# Altium footprint library PCB_IntegratedCircuit.PcbLib: 82 footprints (part 3 of 6)
Each footprint in its own frame and in the unit in brackets; x right, y up, seen from the top. Pads: shape width x height; smd on the part's side, far side on the other; paste and mask are expansions set on the pad; w line width, h text height; cw(c..) or ccw(c..) is an arc to the next point about the centre after c.
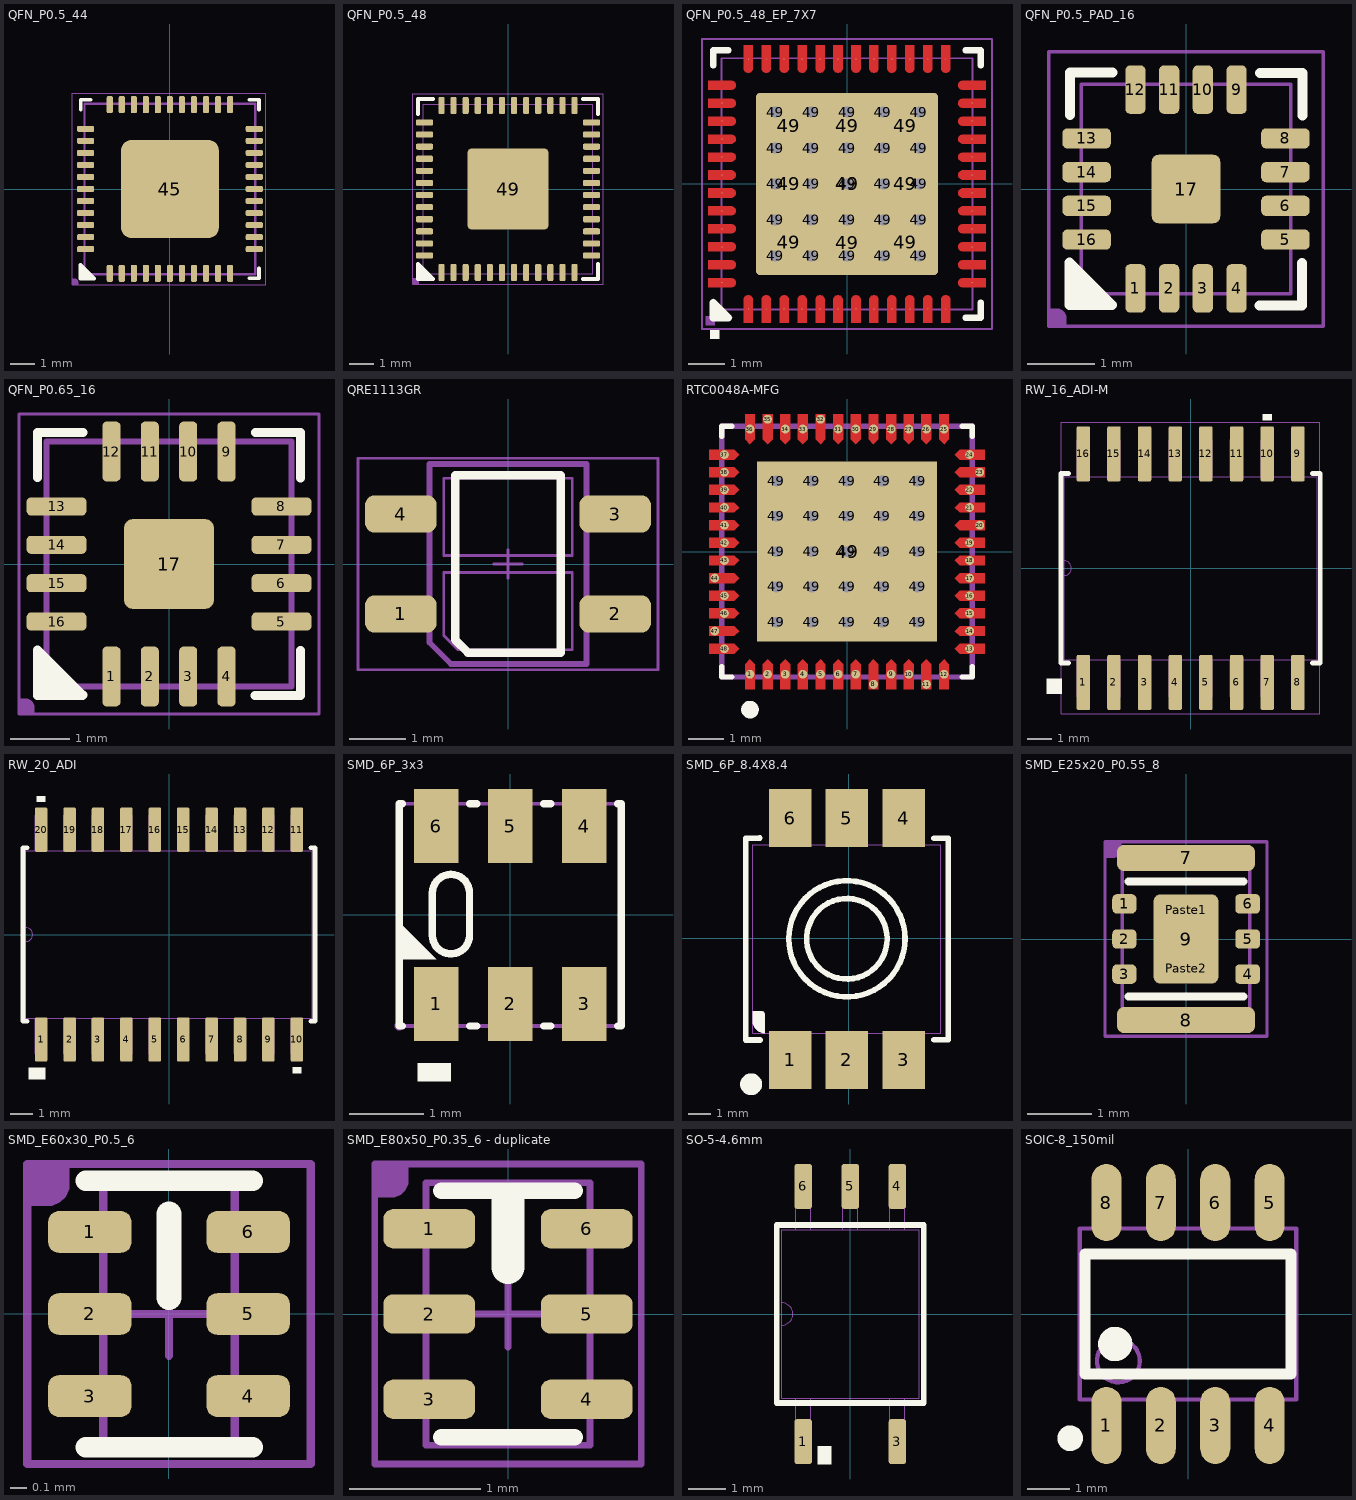
[diagram p2: the footprints below, top view; thin cyan lines are the x and y axes]

## QFN_P0.5_44 [mil]
height 39.37
pads (45):
  rrect50% 10x28 smd: 1(-98.43,-138) 2(-78.74,-138) 3(-59.06,-138) 4(-39.37,-138) 5(-19.68,-138) 6(0,-138) 7(19.69,-138) 8(39.37,-138) 9(59.06,-138) 10(78.74,-138) 11(98.43,-138) 23(98.43,138) 24(78.74,138) 25(59.05,138) 26(39.37,138) 27(19.68,138) 28(0,138) 29(-19.69,138) 30(-39.37,138) 31(-59.06,138) 32(-78.74,138) 33(-98.43,138)
  rrect50% 28x10 smd: 12(138,-98.43) 13(138,-78.74) 14(138,-59.06) 15(138,-39.37) 16(138,-19.69) 17(138,0) 18(138,19.68) 19(138,39.37) 20(138,59.06) 21(138,78.74) 22(138,98.43) 34(-138,98.43) 35(-138,78.74) 36(-138,59.06) 37(-138,39.37) 38(-138,19.68) 39(-138,0) 40(-138,-19.69) 41(-138,-39.37) 42(-138,-59.06) 43(-138,-78.74) 44(-138,-98.43)
  rrect20% 160x160 smd: 45(0,0)
Top Overlay:
  region: -146.34,-124.34 -146.34,-146.34 -124.34,-146.34
  lines w6: -145.76,129.76 -145.76,145.76 -129.76,145.76 ; 129.76,-145.76 145.76,-145.76 145.76,-129.76 ; 129.76,145.76 145.76,145.76 145.76,129.76 ; -146.34,-146.34 -146.34,-124.34 -124.34,-146.34 -146.34,-146.34
Top Solder:
  region: 107.43,-152 107.43,-124 -107.43,-124 -107.43,-152
  region: 107.43,124 107.43,152 -107.43,152 -107.43,124
  region: -124,107.43 -152,107.43 -152,-107.43 -124,-107.43
  region: 152,107.43 124,107.43 124,-107.43 152,-107.43
Mechanical 13:
  lines w2: -10,0 10,0 ; 0,-10 0,10
  lines w4: -139.76,-139.76 -139.76,139.76 139.76,139.76 139.76,-139.76 -139.76,-139.76
T-Component:
  region: -160,-157 -160,-147 -155,-147 -154.01,-147 -152.17,-147.76 -150.76,-149.17 -150,-151.01 -150,-152 -150,-157
  lines w2: -160,-157 157,-157 157,157 -160,157 -160,-157
3D body "User Library-smd_qfn-44-2.STEP": height 35.43, standoff 0, extent -137.84,-137.82 137.83,137.84

## QFN_P0.5_48 [mil]
height 21.65
pads (49):
  rrect50% 10x28 smd: 1(-108.27,-136) 2(-88.58,-136) 3(-68.9,-136) 4(-49.21,-136) 5(-29.53,-136) 6(-9.84,-136) 7(9.84,-136) 8(29.53,-136) 9(49.21,-136) 10(68.9,-136) 11(88.58,-136) 12(108.27,-136) 25(108.27,136) 26(88.58,136) 27(68.9,136) 28(49.21,136) 29(29.53,136) 30(9.84,136) 31(-9.84,136) 32(-29.53,136) 33(-49.21,136) 34(-68.9,136) 35(-88.58,136) 36(-108.27,136)
  rrect50% 28x10 smd: 13(136,-108.27) 14(136,-88.58) 15(136,-68.9) 16(136,-49.21) 17(136,-29.53) 18(136,-9.84) 19(136,9.84) 20(136,29.53) 21(136,49.21) 22(136,68.9) 23(136,88.58) 24(136,108.27) 37(-136,108.27) 38(-136,88.58) 39(-136,68.9) 40(-136,49.21) 41(-136,29.53) 42(-136,9.84) 43(-136,-9.84) 44(-136,-29.53) 45(-136,-49.21) 46(-136,-68.9) 47(-136,-88.58) 48(-136,-108.27)
  rrect10% 132x132 smd: 49(0,0)
Top Overlay:
  region: -146.67,-146.67 -146.67,-122 -122,-146.67
  lines w6: -146.67,122 -146.67,146.67 -122,146.67 ; 122,-146.67 146.67,-146.67 146.67,-122 ; 122,146.67 146.67,146.67 146.67,122 ; -146.67,-146.67 -146.67,-122 -122,-146.67 -146.67,-146.67
Top Solder:
  region: 108.27,-150 108.27,-122 -108.27,-122 -108.27,-150
  region: 150,108.27 122,108.27 122,-108.27 150,-108.27
  region: -108.27,150 -108.27,122 108.27,122 108.27,150
  rectangle: -150,-108.27 -122,108.27
Mechanical 13:
  lines w2: -10,0 10,0 ; 0,-10 0,10 ; -137.8,-137.79 137.8,-137.79 137.8,137.8 -137.8,137.8 -137.8,-137.79
T-Component:
  region: -155,-155 -155,-145 -150,-145 -149.01,-145 -147.17,-145.76 -145.76,-147.17 -145,-149.01 -145,-150 -145,-155
  lines w2: -155,-155 155,-155 155,155 -155,155 -155,-155
3D body "QFN50P700X700X55-48L.step": height 21.65, standoff 0, extent -138.59,-138.58 138.58,138.58

## QFN_P0.5_48_EP_7X7 [mil]
pads (83):
  round 1 smd paste-1 mask+3: 1(-108.27,-137) 2(-88.58,-137) 3(-68.9,-137) 4(-49.21,-137) 5(-29.53,-137) 6(-9.84,-137) 7(9.84,-137) 8(29.53,-137) 9(49.21,-137) 10(68.9,-137) 11(88.58,-137) 12(108.27,-137) 13(137,-108.27) 14(137,-88.58) 15(137,-68.9) 16(137,-49.21) 17(137,-29.53) 18(137,-9.84) 19(137,9.84) 20(137,29.53) 21(137,49.21) 22(137,68.9) 23(137,88.58) 24(137,108.27) 25(108.27,137) 26(88.58,137) 27(68.9,137) 28(49.21,137) 29(29.53,137) 30(9.84,137) 31(-9.84,137) 32(-29.53,137) 33(-49.21,137) 34(-68.9,137) 35(-88.58,137) 36(-108.27,137) 37(-137,108.27) 38(-137,88.58) 39(-137,68.9) 40(-137,49.21) 41(-137,29.53) 42(-137,9.84) 43(-137,-9.84) 44(-137,-29.53) 45(-137,-49.21) 46(-137,-68.9) 47(-137,-88.58) 48(-137,-108.27)
  round 23.62 / inner round 60 / far side round 23.62 hole 12 paste-99999 mask-11.5: 49(-78.74,-78.74) 49(-78.74,-39.37) 49(-78.74,0) 49(-78.74,39.37) 49(-78.74,78.74) 49(-39.37,-78.74) 49(-39.37,-39.37) 49(-39.37,0) 49(-39.37,39.37) 49(-39.37,78.74) 49(0,-78.74) 49(0,-39.37) 49(0,0) 49(0,39.37) 49(0,78.74) 49(39.37,-78.74) 49(39.37,-39.37) 49(39.37,39.37) 49(39.37,78.74) 49(78.74,-78.74) 49(78.74,-39.37) 49(78.74,0) 49(78.74,39.37) 49(78.74,78.74)
  rrect10% 53x53 on Top Paste: 49(-64,-64) 49(-64,0) 49(-64,64) 49(0,-64.63) 49(0,0) 49(0,64) 49(64,-64) 49(64,0) 49(64,64)
  rrect5% 200x200 smd paste-99999 mask+3: 49(0,0)
  round 23.62 hole 12 paste-99999 mask-11.5: 49(39.37,0)
Top Layer:
  region: -152,103.27 -152,113.27 -127,113.27 -126.01,113.27 -124.17,112.51 -122.76,111.1 -122,109.26 -122,108.27 -122,107.27 -122.76,105.44 -124.17,104.03 -126.01,103.27 -127,103.27
  region: -152,83.58 -152,93.58 -127,93.58 -126.01,93.58 -124.17,92.82 -122.76,91.41 -122,89.58 -122,88.58 -122,87.59 -122.76,85.75 -124.17,84.34 -126.01,83.58 -127,83.58
  region: -152,44.21 -152,54.21 -127,54.21 -126.01,54.21 -124.17,53.45 -122.76,52.04 -122,50.21 -122,49.21 -122,48.22 -122.76,46.38 -124.17,44.97 -126.01,44.21 -127,44.21
  region: -152,63.9 -152,73.9 -127,73.9 -126.01,73.9 -124.17,73.14 -122.76,71.73 -122,69.89 -122,68.9 -122,67.9 -122.76,66.07 -124.17,64.66 -126.01,63.9 -127,63.9
  region: -152,4.84 -152,14.84 -127,14.84 -126.01,14.84 -124.17,14.08 -122.76,12.67 -122,10.84 -122,9.84 -122,8.85 -122.76,7.01 -124.17,5.6 -126.01,4.84 -127,4.84
  region: -152,24.53 -152,34.53 -127,34.53 -126.01,34.53 -124.17,33.77 -122.76,32.36 -122,30.52 -122,29.53 -122,28.53 -122.76,26.7 -124.17,25.29 -126.01,24.53 -127,24.53
  region: -152,-34.53 -152,-24.53 -127,-24.53 -126.01,-24.53 -124.17,-25.29 -122.76,-26.7 -122,-28.53 -122,-29.53 -122,-30.52 -122.76,-32.36 -124.17,-33.77 -126.01,-34.53 -127,-34.53
  region: -152,-14.84 -152,-4.84 -127,-4.84 -126.01,-4.84 -124.17,-5.6 -122.76,-7.01 -122,-8.85 -122,-9.84 -122,-10.84 -122.76,-12.67 -124.17,-14.08 -126.01,-14.84 -127,-14.84
  region: -152,-73.9 -152,-63.9 -127,-63.9 -126.01,-63.9 -124.17,-64.66 -122.76,-66.07 -122,-67.9 -122,-68.9 -122,-69.89 -122.76,-71.73 -124.17,-73.14 -126.01,-73.9 -127,-73.9
  region: -152,-54.21 -152,-44.21 -127,-44.21 -126.01,-44.21 -124.17,-44.97 -122.76,-46.38 -122,-48.22 -122,-49.21 -122,-50.21 -122.76,-52.04 -124.17,-53.45 -126.01,-54.21 -127,-54.21
  region: -152,-113.27 -152,-103.27 -127,-103.27 -126.01,-103.27 -124.17,-104.03 -122.76,-105.44 -122,-107.27 -122,-108.27 -122,-109.26 -122.76,-111.1 -124.17,-112.51 -126.01,-113.27 -127,-113.27
  region: -152,-93.58 -152,-83.58 -127,-83.58 -126.01,-83.58 -124.17,-84.34 -122.76,-85.75 -122,-87.59 -122,-88.58 -122,-89.58 -122.76,-91.42 -124.17,-92.82 -126.01,-93.58 -127,-93.58
  region: -113.27,127 -113.27,152 -103.27,152 -103.27,127 -103.27,126.01 -104.03,124.17 -105.44,122.76 -107.27,122 -108.27,122 -109.26,122 -111.1,122.76 -112.51,124.17 -113.27,126.01
  region: -93.58,127 -93.58,152 -83.58,152 -83.58,127 -83.58,126.01 -84.34,124.17 -85.75,122.76 -87.59,122 -88.58,122 -89.58,122 -91.41,122.76 -92.82,124.17 -93.58,126.01
  region: -73.9,127 -73.9,152 -63.9,152 -63.9,127 -63.9,126.01 -64.66,124.17 -66.07,122.76 -67.9,122 -68.9,122 -69.89,122 -71.73,122.76 -73.14,124.17 -73.9,126.01
  region: -54.21,127 -54.21,152 -44.21,152 -44.21,127 -44.21,126.01 -44.97,124.17 -46.38,122.76 -48.22,122 -49.21,122 -50.21,122 -52.04,122.76 -53.45,124.17 -54.21,126.01
  region: -34.53,127 -34.53,152 -24.53,152 -24.53,127 -24.53,126.01 -25.29,124.17 -26.7,122.76 -28.53,122 -29.53,122 -30.52,122 -32.36,122.76 -33.77,124.17 -34.53,126.01
  region: -14.84,127 -14.84,152 -4.84,152 -4.84,127 -4.84,126.01 -5.6,124.17 -7.01,122.76 -8.85,122 -9.84,122 -10.84,122 -12.67,122.76 -14.08,124.17 -14.84,126.01
  region: 4.84,127 4.84,152 14.84,152 14.84,127 14.84,126.01 14.08,124.17 12.67,122.76 10.84,122 9.84,122 8.85,122 7.01,122.76 5.6,124.17 4.84,126.01
  region: 24.53,127 24.53,152 34.53,152 34.53,127 34.53,126.01 33.77,124.17 32.36,122.76 30.52,122 29.53,122 28.53,122 26.7,122.76 25.29,124.17 24.53,126.01
  region: 44.21,127 44.21,152 54.21,152 54.21,127 54.21,126.01 53.45,124.17 52.04,122.76 50.21,122 49.21,122 48.22,122 46.38,122.76 44.97,124.17 44.21,126.01
  region: 63.9,127 63.9,152 73.9,152 73.9,127 73.9,126.01 73.14,124.17 71.73,122.76 69.89,122 68.9,122 67.9,122 66.07,122.76 64.66,124.17 63.9,126.01
  region: 83.58,127 83.58,152 93.58,152 93.58,127 93.58,126.01 92.82,124.17 91.41,122.76 89.58,122 88.58,122 87.59,122 85.75,122.76 84.34,124.17 83.58,126.01
  region: 103.27,127 103.27,152 113.27,152 113.27,127 113.27,126.01 112.51,124.17 111.1,122.76 109.26,122 108.27,122 107.27,122 105.44,122.76 104.03,124.17 103.27,126.01
  region: 122,-108.27 122,-109.26 122.76,-111.1 124.17,-112.51 126.01,-113.27 127,-113.27 152,-113.27 152,-103.27 127,-103.27 126.01,-103.27 124.17,-104.03 122.76,-105.44 122,-107.27
  region: 122,-88.58 122,-89.58 122.76,-91.42 124.17,-92.82 126.01,-93.58 127,-93.58 152,-93.58 152,-83.58 127,-83.58 126.01,-83.58 124.17,-84.34 122.76,-85.75 122,-87.59
  region: 122,-49.21 122,-50.21 122.76,-52.04 124.17,-53.45 126.01,-54.21 127,-54.21 152,-54.21 152,-44.21 127,-44.21 126.01,-44.21 124.17,-44.97 122.76,-46.38 122,-48.22
  region: 122,-29.53 122,-30.52 122.76,-32.36 124.17,-33.77 126.01,-34.53 127,-34.53 152,-34.53 152,-24.53 127,-24.53 126.01,-24.53 124.17,-25.29 122.76,-26.7 122,-28.53
  region: 122,-9.84 122,-10.84 122.76,-12.67 124.17,-14.08 126.01,-14.84 127,-14.84 152,-14.84 152,-4.84 127,-4.84 126.01,-4.84 124.17,-5.6 122.76,-7.01 122,-8.85
  region: 122,9.84 122,8.85 122.76,7.01 124.17,5.6 126.01,4.84 127,4.84 152,4.84 152,14.84 127,14.84 126.01,14.84 124.17,14.08 122.76,12.67 122,10.84
  region: 122,29.53 122,28.53 122.76,26.7 124.17,25.29 126.01,24.53 127,24.53 152,24.53 152,34.53 127,34.53 126.01,34.53 124.17,33.77 122.76,32.36 122,30.52
  region: 122,49.21 122,48.22 122.76,46.38 124.17,44.97 126.01,44.21 127,44.21 152,44.21 152,54.21 127,54.21 126.01,54.21 124.17,53.45 122.76,52.04 122,50.21
  region: 122,68.9 122,67.9 122.76,66.07 124.17,64.66 126.01,63.9 127,63.9 152,63.9 152,73.9 127,73.9 126.01,73.9 124.17,73.14 122.76,71.73 122,69.89
  region: 122,88.58 122,87.59 122.76,85.75 124.17,84.34 126.01,83.58 127,83.58 152,83.58 152,93.58 127,93.58 126.01,93.58 124.17,92.82 122.76,91.41 122,89.58
  region: 122,108.27 122,107.27 122.76,105.44 124.17,104.03 126.01,103.27 127,103.27 152,103.27 152,113.27 127,113.27 126.01,113.27 124.17,112.51 122.76,111.1 122,109.26
  region: 122,-68.9 122,-69.89 122.76,-71.73 124.17,-73.14 126.01,-73.9 127,-73.9 152,-73.9 152,-63.9 127,-63.9 126.01,-63.9 124.17,-64.66 122.76,-66.07 122,-67.9
  region: -93.58,-152 -93.58,-127 -93.58,-126.01 -92.82,-124.17 -91.41,-122.76 -89.58,-122 -88.58,-122 -87.59,-122 -85.75,-122.76 -84.34,-124.17 -83.58,-126.01 -83.58,-127 -83.58,-152
  region: -113.27,-152 -113.27,-127 -113.27,-126.01 -112.51,-124.17 -111.1,-122.76 -109.26,-122 -108.27,-122 -107.27,-122 -105.44,-122.76 -104.03,-124.17 -103.27,-126.01 -103.27,-127 -103.27,-152
  region: 103.27,-152 103.27,-127 103.27,-126.01 104.03,-124.17 105.44,-122.76 107.27,-122 108.27,-122 109.26,-122 111.1,-122.76 112.51,-124.17 113.27,-126.01 113.27,-127 113.27,-152
  region: 83.58,-152 83.58,-127 83.58,-126.01 84.34,-124.17 85.75,-122.76 87.59,-122 88.58,-122 89.58,-122 91.41,-122.76 92.82,-124.17 93.58,-126.01 93.58,-127 93.58,-152
  region: -73.9,-152 -73.9,-127 -73.9,-126.01 -73.14,-124.17 -71.73,-122.76 -69.89,-122 -68.9,-122 -67.9,-122 -66.07,-122.76 -64.66,-124.17 -63.9,-126.01 -63.9,-127 -63.9,-152
  region: -54.21,-152 -54.21,-127 -54.21,-126.01 -53.45,-124.17 -52.04,-122.76 -50.21,-122 -49.21,-122 -48.22,-122 -46.38,-122.76 -44.97,-124.17 -44.21,-126.01 -44.21,-127 -44.21,-152
  region: -34.53,-152 -34.53,-127 -34.53,-126.01 -33.77,-124.17 -32.36,-122.76 -30.52,-122 -29.53,-122 -28.53,-122 -26.7,-122.76 -25.29,-124.17 -24.53,-126.01 -24.53,-127 -24.53,-152
  region: -14.84,-152 -14.84,-127 -14.84,-126.01 -14.08,-124.17 -12.67,-122.76 -10.84,-122 -9.84,-122 -8.85,-122 -7.01,-122.76 -5.6,-124.17 -4.84,-126.01 -4.84,-127 -4.84,-152
  region: 4.84,-152 4.84,-127 4.84,-126.01 5.6,-124.17 7.01,-122.76 8.85,-122 9.84,-122 10.84,-122 12.67,-122.76 14.08,-124.17 14.84,-126.01 14.84,-127 14.84,-152
  region: 24.53,-152 24.53,-127 24.53,-126.01 25.29,-124.17 26.7,-122.76 28.53,-122 29.53,-122 30.52,-122 32.36,-122.76 33.77,-124.17 34.53,-126.01 34.53,-127 34.53,-152
  region: 44.21,-152 44.21,-127 44.21,-126.01 44.97,-124.17 46.38,-122.76 48.22,-122 49.21,-122 50.21,-122 52.04,-122.76 53.45,-124.17 54.21,-126.01 54.21,-127 54.21,-152
  region: 63.9,-152 63.9,-127 63.9,-126.01 64.66,-124.17 66.07,-122.76 67.9,-122 68.9,-122 69.89,-122 71.73,-122.76 73.14,-124.17 73.9,-126.01 73.9,-127 73.9,-152
Top Overlay:
  rectangle: -150,-170 -140,-160
  region: -146.67,-146.67 -146.67,-126 -126,-146.67
  lines w7: -146.67,130 -146.67,146.67 -130,146.67 ; 130,-146.67 146.67,-146.67 146.67,-130 ; 130,146.67 146.67,146.67 146.67,130
  lines w8: -146.67,-146.67 -130,-146.67 -146.67,-130 -146.67,-146.67
Mechanical 13:
  lines w2: -10,0 10,0 ; 0,-10 0,10 ; -137.8,-137.79 137.8,-137.79 137.8,137.8 -137.8,137.8 -137.8,-137.79
T-Component:
  region: -155,-155 -155,-145 -150,-145 -149.01,-145 -147.17,-145.76 -145.76,-147.17 -145,-149.01 -145,-150 -145,-155
  lines w2: -159,-159 159,-159 159,159 -159,159 -159,-159
3D body "RTC0048A.stp": height 33.46, standoff 0, extent -137.8,-137.8 137.8,137.8

## QFN_P0.5_PAD_16 [mm]
height 0.6
pads (17):
  rrect50% 0.3x0.72 smd: 1(-0.75,-1.473) 2(-0.25,-1.473) 3(0.25,-1.473) 4(0.75,-1.473) 9(0.75,1.473) 10(0.25,1.473) 11(-0.25,1.473) 12(-0.75,1.473)
  rrect50% 0.72x0.3 smd: 5(1.473,-0.75) 6(1.473,-0.25) 7(1.473,0.25) 8(1.473,0.75) 13(-1.473,0.75) 14(-1.473,0.25) 15(-1.473,-0.25) 16(-1.473,-0.75)
  rrect20% 1.016x1.016 smd: 17(0,0)
Top Overlay:
  region: -1.727,-1.719 -1.727,-1.092 -1.101,-1.719
  lines w0.152: -1.719,1.101 -1.719,1.727 -1.092,1.727 ; 1.092,-1.727 1.719,-1.727 1.719,-1.101 ; 1.101,1.719 1.727,1.719 1.727,1.092 ; -1.727,-1.719 -1.727,-1.092 -1.101,-1.719 -1.727,-1.719
Top Solder:
  region: -0.75,1.829 -0.75,1.118 0.75,1.118 0.75,1.829
  rectangle: -1.829,-0.75 -1.118,0.75
  region: 1.829,0.75 1.118,0.75 1.118,-0.75 1.829,-0.75
  region: 0.75,-1.829 0.75,-1.118 -0.75,-1.118 -0.75,-1.829
Mechanical 13:
  lines w0.051: -0.254,0 0.254,0 ; 0,-0.254 0,0.254 ; -1.55,-1.55 1.55,-1.55 1.55,1.55 -1.55,1.55 -1.55,-1.55
T-Component:
  region: -2.032,-2.032 -2.032,-1.778 -1.905,-1.778 -1.88,-1.778 -1.833,-1.797 -1.797,-1.833 -1.778,-1.88 -1.778,-1.905 -1.778,-2.032
  lines w0.051: -2.032,-2.032 -2.032,2.032 2.032,2.032 2.032,-2.032 -2.032,-2.032
3D body "QFN50P300X300X100-16N.step": height 1, standoff 0, extent -1.5,-1.5 1.5,1.5

## QFN_P0.65_16 [mil]
height 59.06
pads (17):
  rrect50% 12x40 smd: 1(-38.39,-75) 2(-12.8,-75) 3(12.8,-75) 4(38.39,-75) 9(38.39,75) 10(12.8,75) 11(-12.8,75) 12(-38.39,75)
  rrect50% 40x12 smd: 5(75,-38.39) 6(75,-12.8) 7(75,12.8) 8(75,38.39) 13(-75,38.39) 14(-75,12.8) 15(-75,-12.8) 16(-75,-38.39)
  rrect20% 60x60 smd: 17(0,0)
Top Overlay:
  region: -87.69,-87.69 -87.69,-57.51 -57.5,-87.69
  lines w6: -87.6,57.6 -87.6,87.6 -57.4,87.6 ; -57.6,-87.6 -87.6,-87.6 -87.6,-57.4 -57.5,-87.5 ; 57.4,-87.6 87.6,-87.6 87.6,-57.6 ; 57.6,87.6 87.6,87.6 87.6,57.4
Mechanical 13:
  lines w2: -10,0 10,0 ; 0,-10 0,10
  lines w3.94: -81.69,-81.69 -81.69,81.69 81.69,81.69 81.69,-81.69 -81.69,-81.69
T-Component:
  region: -100,-100 -100,-90 -95,-90 -94.01,-90 -92.17,-90.76 -90.76,-92.17 -90,-94.01 -90,-95 -90,-100
  lines w2: -100,-100 -100,100 100,100 100,-100 -100,-100
3D body "User Library-qfn16-4x4with pad.STEP": height 36.22, standoff 0, extent -78.75,-78.73 78.73,78.75

## QRE1113GR [mil]
height 66.93
pads (4):
  rrect50% 50x26 smd: 1(-75,-35) 2(75,-35) 3(75,35) 4(-75,35)
Top Overlay:
  lines w6: -37,-53 -37,62 37,62 37,-62 -28,-62 -37,-53
Mechanical 13:
  lines w2: -10,0 10,0 ; 0,-10 0,10 ; -45,-50 -45,-6 45,-6 45,-60 -35,-60 -45,-50 ; -45,6 -45,60 45,60 45,6 -45,6
  lines w4: -55,-55 -55,70 55,70 55,-70 -40,-70 -55,-55
T-Component:
  lines w1.97: -105,-74 -105,74 105,74 105,-74 -105,-74

## RTC0048A-MFG [mm]
pads (74):
  round 0.252 smd paste-0.113 mask+0: 1(-2.75,-3.475) 2(-2.25,-3.475) 3(-1.75,-3.475) 4(-1.25,-3.475) 5(-0.75,-3.475) 6(-0.25,-3.475) 7(0.25,-3.475) 8(0.75,-3.76) 9(1.25,-3.475) 10(1.75,-3.475) 11(2.25,-3.76) 12(2.75,-3.475) 13(3.475,-2.75) 14(3.475,-2.25) 15(3.475,-1.75) 16(3.475,-1.25) 17(3.475,-0.75) 18(3.475,-0.25) 19(3.475,0.25) 20(3.76,0.75) 21(3.475,1.25) 22(3.475,1.75) 23(3.76,2.25) 24(3.475,2.75) 25(2.75,3.475) 26(2.25,3.475) 27(1.75,3.475) 28(1.25,3.475) 29(0.75,3.475) 30(0.25,3.475) 31(-0.25,3.475) 32(-0.75,3.75) 33(-1.25,3.475) 34(-1.75,3.475) 35(-2.25,3.75) 36(-2.75,3.475) 37(-3.475,2.75) 38(-3.475,2.25) 39(-3.475,1.75) 40(-3.475,1.25) 41(-3.475,0.75) 42(-3.475,0.25) 43(-3.475,-0.25) 44(-3.75,-0.75) 45(-3.475,-1.25) 46(-3.475,-1.75) 47(-3.75,-2.25) 48(-3.475,-2.75)
  round 0.6 / inner round 1.524 / far side round 0.6 hole 0.305 paste-2539.97 mask-0.292: 49(-2,-2) 49(-2,-1) 49(-2,0) 49(-2,1) 49(-2,2) 49(-1,-2) 49(-1,-1) 49(-1,0) 49(-1,1) 49(-1,2) 49(0,-2) 49(0,-1) 49(0,0) 49(0,1) 49(0,2) 49(1,-2) 49(1,-1) 49(1,0) 49(1,1) 49(1,2) 49(2,-2) 49(2,-1) 49(2,0) 49(2,1) 49(2,2)
  rect 5.1x5.1 smd paste-2.537 mask+0: 49(0,0)
Top Layer:
  region: -3.9,-2.89 -3.9,-2.61 -3.19,-2.61 -3.05,-2.75 -3.19,-2.89
  region: -3.9,-2.39 -3.9,-2.11 -3.19,-2.11 -3.05,-2.25 -3.19,-2.39
  region: -3.9,-1.89 -3.9,-1.61 -3.19,-1.61 -3.05,-1.75 -3.19,-1.89
  region: -3.9,-1.39 -3.9,-1.11 -3.19,-1.11 -3.05,-1.25 -3.19,-1.39
  region: -3.9,-0.89 -3.9,-0.61 -3.19,-0.61 -3.05,-0.75 -3.19,-0.89
  region: -3.9,-0.39 -3.9,-0.11 -3.19,-0.11 -3.05,-0.25 -3.19,-0.39
  region: -3.9,0.11 -3.9,0.39 -3.19,0.39 -3.05,0.25 -3.19,0.11
  region: -3.9,0.61 -3.9,0.89 -3.19,0.89 -3.05,0.75 -3.19,0.61
  region: -3.9,1.11 -3.9,1.39 -3.19,1.39 -3.05,1.25 -3.19,1.11
  region: -3.9,1.61 -3.9,1.89 -3.19,1.89 -3.05,1.75 -3.19,1.61
  region: -3.9,2.11 -3.9,2.39 -3.19,2.39 -3.05,2.25 -3.19,2.11
  region: -3.9,2.61 -3.9,2.89 -3.19,2.89 -3.05,2.75 -3.19,2.61
  region: -2.89,3.9 -2.61,3.9 -2.61,3.19 -2.75,3.05 -2.89,3.19
  region: -2.39,3.9 -2.11,3.9 -2.11,3.19 -2.25,3.05 -2.39,3.19
  region: -1.89,3.9 -1.61,3.9 -1.61,3.19 -1.75,3.05 -1.89,3.19
  region: -1.39,3.9 -1.11,3.9 -1.11,3.19 -1.25,3.05 -1.39,3.19
  region: -0.89,3.9 -0.61,3.9 -0.61,3.19 -0.75,3.05 -0.89,3.19
  region: -0.39,3.9 -0.11,3.9 -0.11,3.19 -0.25,3.05 -0.39,3.19
  region: 0.11,3.9 0.39,3.9 0.39,3.19 0.25,3.05 0.11,3.19
  region: 0.61,3.9 0.89,3.9 0.89,3.19 0.75,3.05 0.61,3.19
  region: 1.11,3.9 1.39,3.9 1.39,3.19 1.25,3.05 1.11,3.19
  region: 1.61,3.9 1.89,3.9 1.89,3.19 1.75,3.05 1.61,3.19
  region: 2.11,3.9 2.39,3.9 2.39,3.19 2.25,3.05 2.11,3.19
  region: 2.61,3.9 2.89,3.9 2.89,3.19 2.75,3.05 2.61,3.19
  region: 3.9,2.89 3.9,2.61 3.19,2.61 3.05,2.75 3.19,2.89
  region: 3.9,2.39 3.9,2.11 3.19,2.11 3.05,2.25 3.19,2.39
  region: 3.9,1.89 3.9,1.61 3.19,1.61 3.05,1.75 3.19,1.89
  region: 3.9,1.39 3.9,1.11 3.19,1.11 3.05,1.25 3.19,1.39
  region: 3.9,0.89 3.9,0.61 3.19,0.61 3.05,0.75 3.19,0.89
  region: 3.9,0.39 3.9,0.11 3.19,0.11 3.05,0.25 3.19,0.39
  region: 3.9,-0.11 3.9,-0.39 3.19,-0.39 3.05,-0.25 3.19,-0.11
  region: 3.9,-0.61 3.9,-0.89 3.19,-0.89 3.05,-0.75 3.19,-0.61
  region: 3.9,-1.11 3.9,-1.39 3.19,-1.39 3.05,-1.25 3.19,-1.11
  region: 3.9,-1.61 3.9,-1.89 3.19,-1.89 3.05,-1.75 3.19,-1.61
  region: 3.9,-2.11 3.9,-2.39 3.19,-2.39 3.05,-2.25 3.19,-2.11
  region: 3.9,-2.61 3.9,-2.89 3.19,-2.89 3.05,-2.75 3.19,-2.61
  region: 2.89,-3.9 2.61,-3.9 2.61,-3.19 2.75,-3.05 2.89,-3.19
  region: 2.39,-3.9 2.11,-3.9 2.11,-3.19 2.25,-3.05 2.39,-3.19
  region: 1.89,-3.9 1.61,-3.9 1.61,-3.19 1.75,-3.05 1.89,-3.19
  region: 1.39,-3.9 1.11,-3.9 1.11,-3.19 1.25,-3.05 1.39,-3.19
  region: 0.89,-3.9 0.61,-3.9 0.61,-3.19 0.75,-3.05 0.89,-3.19
  region: 0.39,-3.9 0.11,-3.9 0.11,-3.19 0.25,-3.05 0.39,-3.19
  region: -0.11,-3.9 -0.39,-3.9 -0.39,-3.19 -0.25,-3.05 -0.11,-3.19
  region: -0.61,-3.9 -0.89,-3.9 -0.89,-3.19 -0.75,-3.05 -0.61,-3.19
  region: -1.11,-3.9 -1.39,-3.9 -1.39,-3.19 -1.25,-3.05 -1.11,-3.19
  region: -1.61,-3.9 -1.89,-3.9 -1.89,-3.19 -1.75,-3.05 -1.61,-3.19
  region: -2.11,-3.9 -2.39,-3.9 -2.39,-3.19 -2.25,-3.05 -2.11,-3.19
  region: -2.61,-3.9 -2.89,-3.9 -2.89,-3.19 -2.75,-3.05 -2.61,-3.19
Top Overlay:
  circle w0.25: c-2.75,-4.475 r0.125
  lines w0.15: -3.55,-3.265 -3.55,-3.55 -3.265,-3.55 ; -3.55,3.265 -3.55,3.55 -3.265,3.55 ; 3.265,-3.55 3.55,-3.55 3.55,-3.265 ; 3.265,3.55 3.55,3.55 3.55,3.265
Top Paste:
  drawing of 57 lines, arcs and shapes, not listed
Top Solder:
  drawing of 48 lines, arcs and shapes, not listed
Mechanical 13:
  lines w0.15: -3.55,-3.55 3.55,-3.55 3.55,3.55 -3.55,3.55 -3.55,-3.55
3D body "RTC0048A.stp": height 0.85, standoff 0, extent -3.5,-3.5 3.5,3.5

## RW_16_ADI-M [mil]
pads (16):
  rrect25% 22x90 smd paste+0 mask+2: 1(-175,-186.5) 2(-125,-186.5) 3(-75,-186.5) 4(-25,-186.5) 5(25,-186.5) 6(75,-186.5) 7(125,-186.5) 8(175,-186.5) 9(175,186.5) 10(125,186.5) 11(75,186.5) 12(25,186.5) 13(-25,186.5) 14(-75,186.5) 15(-125,186.5) 16(-175,186.5)
Top Overlay:
  region: -210,-205 -210,-180 -235,-180 -235,-205
  region: 117.5,241.5 117.5,251.5 132.5,251.5 132.5,241.5
  lines w8: -199.1,-154.5 -211.5,-154.5 -211.5,154.5 -199.1,154.5 ; 199.1,-154.5 211.5,-154.5 211.5,154.5 199.1,154.5
Mechanical 13:
  lines w0: -206.5,-12 ccw(c-206.5,0) -206.5,12
  lines w1: -206.5,-149.5 206.5,-149.5 206.5,149.5 -206.5,149.5 -206.5,-149.5 ; -185,-209.5 -165,-209.5 -165,-149.5 -185,-149.5 -185,-209.5 ; -185,149.5 -185,209.5 -165,209.5 -165,149.5 -185,149.5 ; -135,-209.5 -115,-209.5 -115,-149.5 -135,-149.5 -135,-209.5 ; -135,149.5 -135,209.5 -115,209.5 -115,149.5 -135,149.5 ; -85,-209.5 -65,-209.5 -65,-149.5 -85,-149.5 -85,-209.5 ; -85,149.5 -85,209.5 -65,209.5 -65,149.5 -85,149.5 ; -35,-209.5 -15,-209.5 -15,-149.5 -35,-149.5 -35,-209.5 ; -35,149.5 -35,209.5 -15,209.5 -15,149.5 -35,149.5 ; 15,-209.5 35,-209.5 35,-149.5 15,-149.5 15,-209.5 ; 15,149.5 15,209.5 35,209.5 35,149.5 15,149.5 ; 65,-209.5 85,-209.5 85,-149.5 65,-149.5 65,-209.5 ; 65,149.5 65,209.5 85,209.5 85,149.5 65,149.5 ; 115,-209.5 135,-209.5 135,-149.5 115,-149.5 115,-209.5 ; 115,149.5 115,209.5 135,209.5 135,149.5 115,149.5 ; 165,-209.5 185,-209.5 185,-149.5 165,-149.5 165,-209.5 ; 165,149.5 165,209.5 185,209.5 185,149.5 165,149.5
T-Component:
  lines w2: -211,-238 211,-238 211,237.85 -211,237.85 -211,-238
3D body "ADUM3160BRWZ.STEP": height 104.33, standoff 0, extent -202.76,-203.25 202.76,203.25

## RW_20_ADI [mil]
pads (20):
  rrect25% 22.08x78 smd paste+0 mask+2: 1(-225,-184.65) 2(-175,-184.65) 3(-125,-184.65) 4(-75,-184.65) 5(-25,-184.65) 6(25,-184.65) 7(75,-184.65) 8(125,-184.65) 9(175,-184.65) 10(225,-184.65) 11(225,184.65) 12(175,184.65) 13(125,184.65) 14(75,184.65) 15(25,184.65) 16(-25,184.65) 17(-75,184.65) 18(-125,184.65) 19(-175,184.65) 20(-225,184.65)
Top Overlay:
  region: -217.5,-255.3 -217.5,-233.65 -247.03,-233.65 -247.03,-255.3
  region: 217.5,-233.65 217.5,-243.65 232.5,-243.65 232.5,-233.65
  region: -232.5,233.65 -232.5,243.65 -217.5,243.65 -217.5,233.65
  lines w8: -249.14,-152.64 -256.97,-152.64 -256.97,152.64 -249.14,152.64 ; 249.14,-152.64 256.97,-152.64 256.97,152.64 249.14,152.64
Mechanical 13:
  lines w0: -251.97,-12 ccw(c-251.97,0) -251.97,12
  lines w1: -251.97,-147.64 -251.97,147.64 251.97,147.64 251.97,-147.64 -251.97,-147.64 ; -235.04,-209.65 -235.04,-147.64 -214.96,-147.64 -214.96,-209.65 -235.04,-209.65 ; -235.04,147.64 -214.96,147.64 -214.96,209.65 -235.04,209.65 -235.04,147.64 ; -185.04,-209.65 -185.04,-147.64 -164.96,-147.64 -164.96,-209.65 -185.04,-209.65 ; -185.04,147.64 -164.96,147.64 -164.96,209.65 -185.04,209.65 -185.04,147.64 ; -135.04,-209.65 -135.04,-147.64 -114.96,-147.64 -114.96,-209.65 -135.04,-209.65 ; -135.04,147.64 -114.96,147.64 -114.96,209.65 -135.04,209.65 -135.04,147.64 ; -85.04,-209.65 -85.04,-147.64 -64.96,-147.64 -64.96,-209.65 -85.04,-209.65 ; -85.04,147.64 -64.96,147.64 -64.96,209.65 -85.04,209.65 -85.04,147.64 ; -35.04,-209.65 -35.04,-147.64 -14.96,-147.64 -14.96,-209.65 -35.04,-209.65 ; -35.04,147.64 -14.96,147.64 -14.96,209.65 -35.04,209.65 -35.04,147.64 ; 14.96,-209.65 14.96,-147.64 35.04,-147.64 35.04,-209.65 14.96,-209.65 ; 14.96,147.64 35.04,147.64 35.04,209.65 14.96,209.65 14.96,147.64 ; 64.96,-209.65 64.96,-147.64 85.04,-147.64 85.04,-209.65 64.96,-209.65 ; 64.96,147.64 85.04,147.64 85.04,209.65 64.96,209.65 64.96,147.64 ; 114.96,-209.65 114.96,-147.64 135.04,-147.64 135.04,-209.65 114.96,-209.65 ; 114.96,147.64 135.04,147.64 135.04,209.65 114.96,209.65 114.96,147.64 ; 164.96,-209.65 164.96,-147.64 185.04,-147.64 185.04,-209.65 164.96,-209.65 ; 164.96,147.64 185.04,147.64 185.04,209.65 164.96,209.65 164.96,147.64 ; 214.96,-209.65 214.96,-147.64 235.04,-147.64 235.04,-209.65 214.96,-209.65 ; 214.96,147.64 235.04,147.64 235.04,209.65 214.96,209.65 214.96,147.64
3D body "RW_20_ADI.step": height 104.45, standoff 0, extent -251.97,-209.65 251.97,209.65
3D body "RW_20_ADI.step": height 104.45, standoff 0, extent -251.97,-209.65 251.97,209.65

## SMD_6P_3x3 [mm]
pads (6):
  rect 0.6x1 smd paste+0 mask+0.05: 1(-1,-1.2) 2(0,-1.2) 3(1,-1.2) 4(1,1.2) 5(0,1.2) 6(-1,1.2)
Top Overlay:
  region: -0.8,-2.25 -0.8,-2 -1.25,-2 -1.25,-2.25
  region: -1.5,-0.6 -1,-0.6 -1.5,-0.1
  lines w0.1: -1.454,-1.5 -1.5,-1.5 -1.5,1.5 -1.454,1.5 ; -0.546,-1.5 -0.454,-1.5 ; -0.546,1.5 -0.454,1.5 ; 0.454,-1.5 0.546,-1.5 ; 0.454,1.5 0.546,1.5 ; 1.454,-1.5 1.5,-1.5 1.5,1.5 1.454,1.5 ; -1.05,-0.275 ccw(c-0.8,-0.275) -0.55,-0.275 -0.55,0.3 ccw(c-0.8,0.297) -1.051,0.299 -1.05,-0.275
B-Component:
  region: -1.2,-1.275 -1.2,-0.725 -0.8,-0.725 -0.8,-1.275
  region: -0.2,-1.275 -0.2,-0.725 0.2,-0.725 0.2,-1.275
  region: 0.8,-1.275 0.8,-0.725 1.2,-0.725 1.2,-1.275
  region: 0.8,0.725 0.8,1.275 1.2,1.275 1.2,0.725
  region: -0.2,0.725 -0.2,1.275 0.2,1.275 0.2,0.725
  region: -1.2,0.725 -1.2,1.275 -0.8,1.275 -0.8,0.725
  region: -1.5,-1.44 -1.525,-1.44 -1.56,-1.475 -1.56,-1.525 -1.525,-1.56 -1.5,-1.56 -1.475,-1.56 -1.44,-1.525 -1.44,-1.475 -1.475,-1.44
  lines w0.051: -1.5,-1.5 -1.5,1.5 1.5,1.5 1.5,-1.5 -1.5,-1.5
3D body "3D_PCB1_2024-05-11.step": height 1.02, standoff 0.02, extent -1.5,-1.5 1.5,1.5

## SMD_6P_8.4X8.4 [mm]
pads (6):
  rect 1.9x2.6 smd paste+0 mask+0.051: 1(-2.624,-5.431) 2(-0.084,-5.431) 3(2.456,-5.431) 4(2.456,5.369) 5(-0.084,5.369) 6(-2.624,5.369)
Top Overlay:
  circle w0.6: c-4.364,-6.521 r0.187
  circle w0.254: c-0.084,-0.021 r2.594
  circle w0.254: c-0.084,-0.021 r1.8
  region: -4.284,-3.261 -4.284,-3.691 -4.284,-3.798 -4.202,-3.997 -4.05,-4.149 -3.851,-4.231 -3.744,-4.231 -3.744,-3.411 -3.744,-3.381 -3.767,-3.326 -3.809,-3.284 -3.864,-3.261 -3.894,-3.261
  lines w0.254: -3.984,4.479 -4.605,4.468 -4.605,-4.541 -3.965,-4.541 ; 3.81,-4.531 4.445,-4.531 4.445,4.468 3.81,4.468
Mechanical 6:
  region: -4.284,-3.261 -4.284,-3.691 -4.284,-3.798 -4.202,-3.997 -4.05,-4.149 -3.851,-4.231 -3.744,-4.231 -3.744,-3.411 -3.744,-3.381 -3.767,-3.326 -3.809,-3.284 -3.864,-3.261 -3.894,-3.261
B-Component:
  region: -4.284,-6.271 -4.309,-6.271 -4.344,-6.306 -4.344,-6.356 -4.309,-6.391 -4.284,-6.391 -4.259,-6.391 -4.224,-6.356 -4.224,-6.306 -4.259,-6.271
  region: 3.206,4.159 1.706,4.159 1.706,5.079 3.206,5.079
  region: 3.206,5.069 1.706,5.069 1.706,6.269 3.206,6.269
  region: 0.666,4.159 -0.834,4.159 -0.834,5.079 0.666,5.079
  region: 0.666,5.069 -0.834,5.069 -0.834,6.269 0.666,6.269
  region: -1.874,4.159 -3.374,4.159 -3.374,5.079 -1.874,5.079
  region: -1.874,5.069 -3.374,5.069 -3.374,6.269 -1.874,6.269
  region: 3.206,-5.141 1.706,-5.141 1.706,-4.221 3.206,-4.221
  region: 3.206,-6.331 1.706,-6.331 1.706,-5.131 3.206,-5.131
  region: 0.666,-5.141 -0.834,-5.141 -0.834,-4.221 0.666,-4.221
  region: 0.666,-6.331 -0.834,-6.331 -0.834,-5.131 0.666,-5.131
  region: -1.874,-5.141 -3.374,-5.141 -3.374,-4.221 -1.874,-4.221
  region: -1.874,-6.331 -3.374,-6.331 -3.374,-5.131 -1.874,-5.131
  lines w0.051: -4.284,-4.231 4.116,-4.231 4.116,4.169 -4.284,4.169 -4.284,-4.231
3D body "3D_PCB1_2024-05-11.step": height 12.58, standoff 0, extent -4.2,-6.3 4.2,6.3

## SMD_E25x20_P0.55_8 [mil]
pads (11):
  rrect50% 15x12 smd mask+0: 1(-38,21.65) 2(-38,0) 3(-38,-21.65)
  rrect40% 15x12 smd mask+0: 4(38,-21.65) 5(38,0) 6(38,21.65)
  rrect50% 85x16 smd paste+0 mask+0: 7(0,50)
  rrect50% 85x16 smd mask+0: 8(0,-50)
  rrect20% 40x55 smd paste-55 mask+0: 9(0,0)
  rrect20% 36x16 on Top Paste mask+1.97: Paste1(0,18) Paste2(0,-18)
Top Overlay:
  lines w5: -35.43,-35.43 35.43,-35.43 ; -35.43,35.43 35.43,35.43
Mechanical 13:
  lines w2: -10,0 10,0 ; 0,-10 0,10 ; -39.37,-49.21 -39.37,49.21 39.37,49.21 39.37,-49.21 -39.37,-49.21
T-Component:
  region: -50,60 -40,60 -40,55 -40,54.01 -40.76,52.17 -42.17,50.76 -44.01,50 -45,50 -50,50
  lines w2: -50,-60 50,-60 50,60 -50,60 -50,-60
3D body "User Library-Osc KC2520.STEP": height 31.1, standoff 0, extent -39.36,-49.22 39.37,49.21

## SMD_E60x30_P0.5_6 [mil]
pads (6):
  rrect50% 20x10 smd: 1(-19,19.69) 2(-19,0) 3(-19,-19.68) 4(19,-19.68) 5(19,0) 6(19,19.69)
Top Overlay:
  lines w5: -20,-32 20,-32 ; -20,32 20,32
  lines w6: 0,4 0,24
Mechanical 13:
  lines w2: -10,0 10,0 ; 0,-10 0,10 ; 15.75,-31.5 -15.75,-31.5 -15.75,31.5 15.75,31.5 15.75,-31.5 ; 15.75,-31.5 15.75,-31.5
T-Component:
  region: -34,36 -24,36 -24,31 -24,30.01 -24.76,28.17 -26.17,26.76 -28.01,26 -29,26 -34,26
  lines w2: -34,-36 34,-36 34,36 -34,36 -34,-36
3D body: height 23.62, standoff 0, extent -15.75,-31.49 15.74,31.5
3D body: height 24.41, standoff 0, extent -15.95,15.76 -10.04,23.63
3D body: height 24.41, standoff 0, extent -15.95,-3.93 -10.04,3.94
3D body: height 24.41, standoff 0, extent 10.42,-23.62 16.33,-15.75
3D body: height 24.41, standoff 0, extent 10.42,-3.94 16.33,3.94
3D body: height 24.41, standoff 0, extent 10.42,15.75 16.33,23.62
3D body: height 24.41, standoff 0, extent -1.38,15.75 1.77,23.63
3D body: height 24.41, standoff 0, extent -15.95,-23.62 -10.04,-15.74

## SMD_E80x50_P0.35_6 - duplicate [mm]
pads (6):
  rrect50% 0.7x0.3 smd mask+0.05: 1(-0.6,0.65) 2(-0.6,0) 3(-0.6,-0.65) 4(0.6,-0.65) 5(0.6,0) 6(0.6,0.65)
Top Overlay:
  lines w0.127: -0.508,-0.94 0.508,-0.94 ; -0.508,0.94 0.508,0.94
  lines w0.254: 0,0.356 0,0.864
Mechanical 13:
  lines w0.051: -0.625,-1 0.625,-1 0.625,1 ; -0.254,0 0.254,0 ; 0,-0.254 0,0.254 ; -0.625,1 -0.625,-1 -0.625,1 ; -0.625,1 0.625,1 ; -0.625,1 0.625,1
T-Component:
  region: -1.016,1.143 -0.762,1.143 -0.762,1.016 -0.762,0.991 -0.781,0.944 -0.817,0.908 -0.864,0.889 -0.889,0.889 -1.016,0.889
  lines w0.051: -1.016,-1.143 -1.016,1.143 1.016,1.143 1.016,-1.143 -1.016,-1.143
3D body "User Library-1600BL15B100E.STEP": height 0.87, standoff 0.01, extent -0.635,-1 0.635,1

## SO-5-4.6mm [mil]
pads (5):
  rrect25% 18.36x47.56 smd paste+0 mask+2: 1(-50,-135.5) 3(50,-135.5) 4(50,135.5) 5(0,135.5) 6(-50,135.5)
Top Overlay:
  region: -20,-160 -20,-140 -35,-140 -35,-160
  lines w6: -78,-94.5 -78,94.5 78,94.5 78,-94.5 -78,-94.5
Mechanical 13:
  lines w0: -73,-12 ccw(c-73,0) -73,12
  lines w1: -73,-89.5 -73,89.5 73,89.5 73,-89.5 -73,-89.5 ; -58,-145.5 -58,-89.5 -42,-89.5 -42,-145.5 -58,-145.5 ; -58,89.5 -42,89.5 -42,145.5 -58,145.5 -58,89.5 ; -8,89.5 8,89.5 8,145.5 -8,145.5 -8,89.5 ; 42,-145.5 42,-89.5 58,-89.5 58,-145.5 42,-145.5 ; 42,89.5 58,89.5 58,145.5 42,145.5 42,89.5
3D body "5pin SO6.step": height 86.61, standoff 0, extent -72.83,-137.8 72.83,137.8

## SOIC-8_150mil [mm]
pads (8):
  oval 0.7x1.8 smd: 1(-1.905,-2.6) 2(-0.635,-2.6) 3(0.635,-2.6) 4(1.905,-2.6) 5(1.905,2.6) 6(0.635,2.6) 7(-0.635,2.6) 8(-1.905,2.6)
Top Overlay:
  circle w0.4: c-1.7,-0.7 r0.2
  circle w0.3: c-2.75,-2.9 r0.15
  lines w0.254: -2.4,-1.4 -2.4,1.4 2.4,1.4 2.4,-1.4 -2.4,-1.4
Mechanical 13:
  circle w0.1: c-1.625,-1.095 r0.5
  lines w0.1: -2.525,-1.995 -2.525,1.995 2.525,1.995 2.525,-1.995 -2.525,-1.995
3D body "User Library-so8-3.step": height 1.7, standoff 0, extent -2.45,-3 2.45,3